# Altium footprint library 2.54-华普微电子模块.PcbLib: 59 footprints (part 1 of 4)
Each footprint in its own frame and in the unit in brackets; x right, y up, seen from the top. Pads: shape width x height; smd on the part's side, far side on the other; paste and mask are expansions set on the pad; w line width, h text height; cw(c..) or ccw(c..) is an arc to the next point about the centre after c.
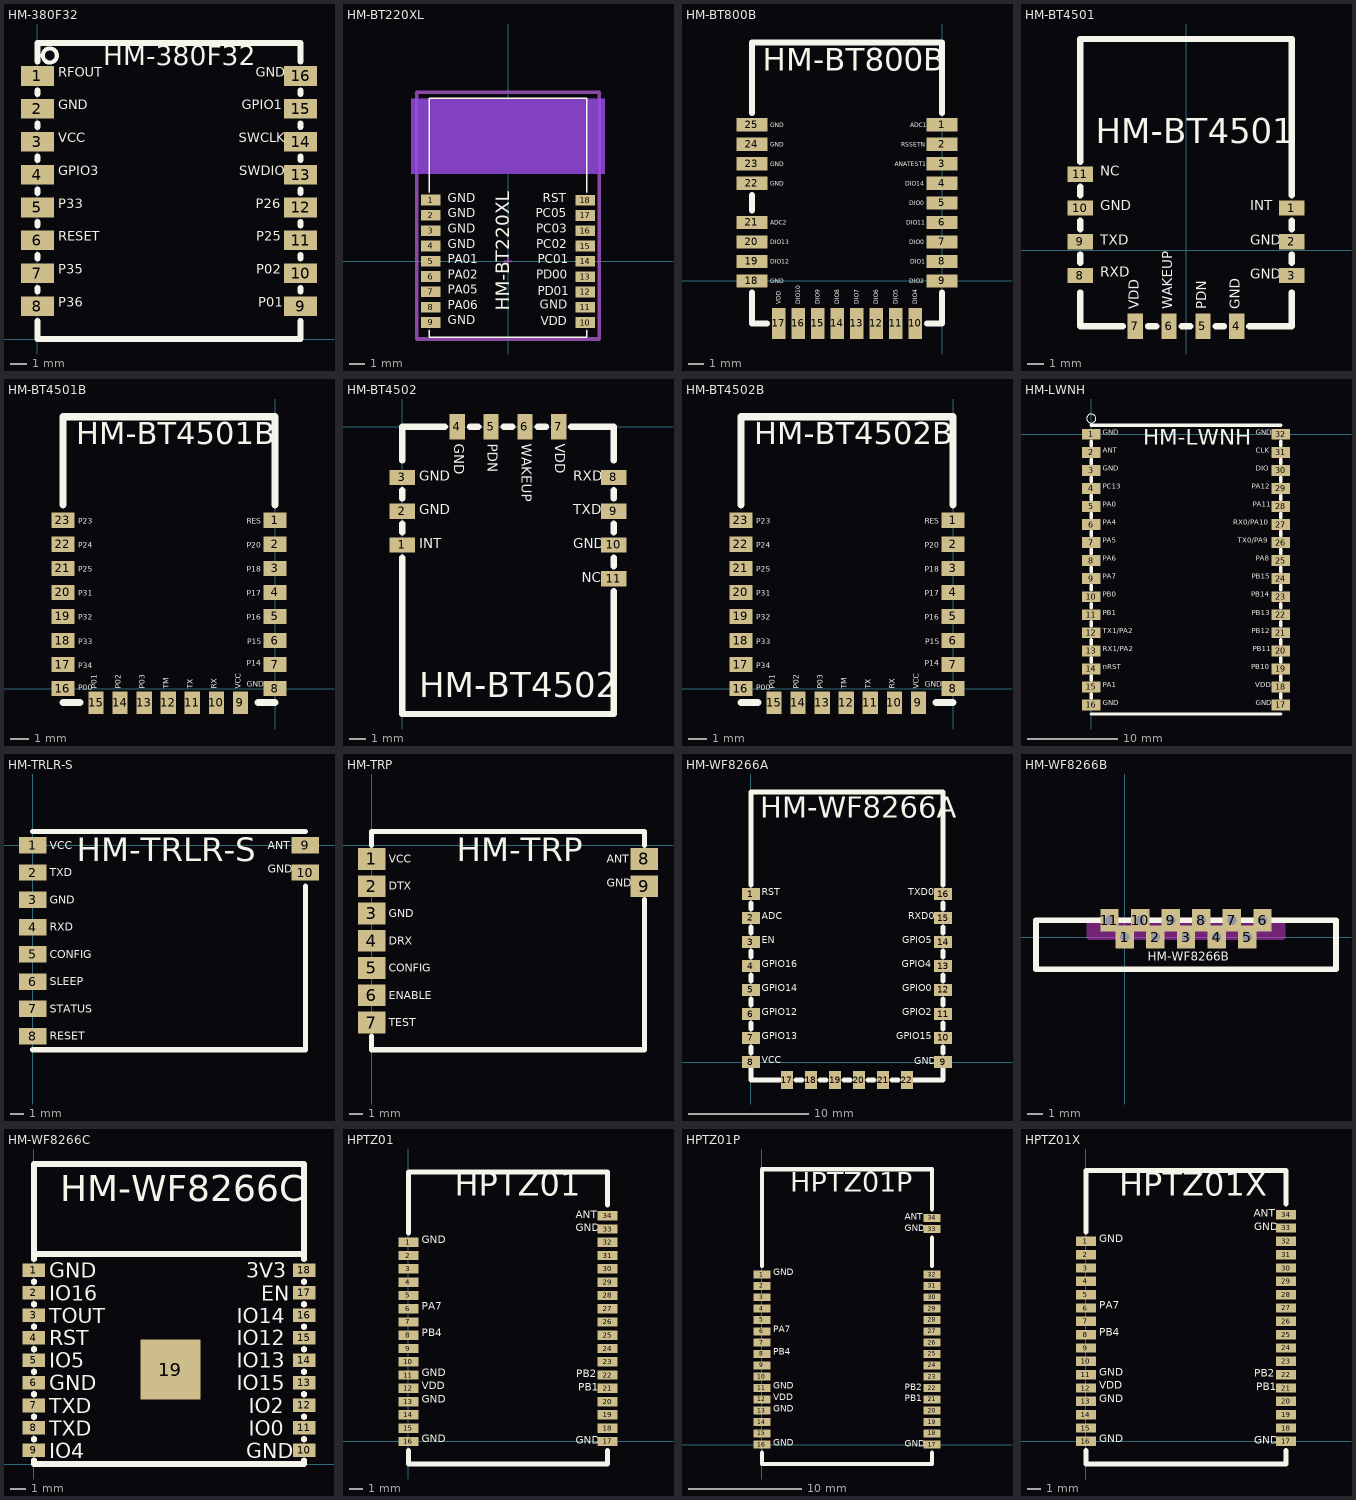
[diagram p0: the footprints below, top view; thin cyan lines are the x and y axes]

## HM-380F32 [mm]
pads (16):
  rect 2x1.2 smd: 1(0,16) 2(0,14) 3(0,12) 4(0,10) 5(0,8) 6(0,6) 7(0,4) 8(0,2) 9(16,2) 10(16,4) 11(16,6) 12(16,8) 13(16,10) 14(16,12) 15(16,14) 16(16,16)
Top Overlay:
  circle w0.254: c0.75,17.25 r0.43
  lines w0.381: 0,1.1 0,0 16,0 16,1.1 ; 0,2.9 0,3.1 ; 0,4.9 0,5.1 ; 0,6.9 0,7.1 ; 0,8.9 0,9.1 ; 0,10.9 0,11.1 ; 0,12.9 0,13.1 ; 0,14.9 0,15.1 ; 0,16.9 0,18 16,18 16,16.9 ; 16,2.9 16,3.1 ; 16,4.9 16,5.1 ; 16,6.9 16,7.1 ; 16,8.9 16,9.1 ; 16,10.9 16,11.1 ; 16,12.9 16,13.1 ; 16,14.9 16,15.1
  text "HM-380F32" at 4,16.25 h2
  text "GND" at 13.268,15.75 h1
  text "RFOUT" at 1.25,15.75 h1
  text "GPIO1" at 12.429,13.75 h1
  text "SWCLK" at 12.25,11.75 h1
  text "SWDIO" at 12.266,9.75 h1
  text "P26" at 13.266,7.75 h1
  text "P25" at 13.298,5.75 h1
  text "P02" at 13.299,3.75 h1
  text "P01" at 13.444,1.75 h1
  text "GND" at 1.25,13.75 h1
  text "VCC" at 1.25,11.75 h1
  text "GPIO3" at 1.25,9.75 h1
  text "P33" at 1.25,7.75 h1
  text "RESET" at 1.25,5.75 h1
  text "P35" at 1.25,3.75 h1
  text "P36" at 1.25,1.75 h1

## HM-BT220XL [mm] "HM-BT220XL"
pads (18):
  rect 1.3x0.7 smd: 1(-5.05,4.001) 2(-5.05,3.001) 3(-5.05,2.001) 4(-5.05,1.001) 5(-5.05,0.002) 6(-5.05,-0.998) 7(-5.05,-1.998) 8(-5.05,-2.998) 9(-5.05,-3.998) 10(5.05,-4.001) 11(5.05,-3.001) 12(5.05,-2.001) 13(5.05,-1.001) 14(5.05,-0.001) 15(5.05,0.998) 16(5.05,1.998) 17(5.05,2.998) 18(5.05,3.998)
Top Layer keep-out:
  region: 6.35,5.715 6.35,10.651 -6.35,10.651 -6.35,5.715
Bottom Layer keep-out:
  region: 6.35,5.715 6.35,10.651 -6.35,10.651 -6.35,5.715
Top Overlay:
  lines w0.1: -5.151,-4.511 -5.151,-4.972 5.15,-4.972 5.15,-4.516 ; -5.151,4.524 -5.151,10.651 5.15,10.651 5.15,4.53
  text "GND" at -3.937,-4.318 h1
  text "PA06" at -3.937,-3.33 h1
  text "PA05" at -3.937,-2.33 h1
  text "PA02" at -3.937,-1.33 h1
  text "PA01" at -3.937,-0.33 h1
  text "GND" at -3.937,0.67 h1
  text "GND" at -3.937,1.67 h1
  text "GND" at -3.937,2.67 h1
  text "GND" at -3.937,3.67 h1
  text "VDD" at 2.125,-4.38 h1
  text "GND" at 2.069,-3.302 h1
  text "PD01" at 1.959,-2.413 h1
  text "PD00" at 1.836,-1.33 h1
  text "PC01" at 1.959,-0.33 h1
  text "PC02" at 1.841,0.67 h1
  text "PC03" at 1.835,1.67 h1
  text "PC05" at 1.83,2.67 h1
  text "RST" at 2.262,3.67 h1
  text "HM-BT220XL" at 0.37,-3.233 h1.52
Mechanical 15:
  lines w0.1: -0.254,0 0.254,0 ; 0,-0.254 0,0.254
  lines w0.254: -5.969,-5.08 5.969,-5.08 5.969,11.049 -5.969,11.049 -5.969,-5.08

## HM-BT800B [mm]
pads (25):
  rect 2x0.85 smd: 1(0,10) 2(0,8.75) 3(0,7.5) 4(0,6.25) 5(0,5) 6(0,3.75) 7(0,2.5) 8(0,1.25) 9(0,0) 18(-12.19,0) 19(-12.19,1.25) 20(-12.19,2.5) 21(-12.19,3.75) 22(-12.19,6.25) 23(-12.19,7.5) 24(-12.19,8.75) 25(-12.19,10)
  rect 0.85x2 smd: 10(-1.72,-2.72) 11(-2.97,-2.72) 12(-4.22,-2.72) 13(-5.47,-2.72) 14(-6.72,-2.72) 15(-7.97,-2.72) 16(-9.22,-2.72) 17(-10.47,-2.72)
Top Overlay:
  lines w0.381: -12.19,-0.75 -12.19,-2.72 -11.22,-2.72 ; -12.19,4.5 -12.19,5.5 ; -12.19,10.75 -12.19,15.28 0,15.28 0,10.75 ; -0.97,-2.72 0,-2.72 0,-0.75
  text "ADC1" at -2.051,9.75 h0.5
  text "GND" at -11,9.75 h0.5
  text "VDD" at -10.25,-1.5 h0.5
  text "GND" at -11,8.5 h0.5
  text "RSSETN" at -2.609,8.5 h0.5
  text "GND" at -11,7.25 h0.5
  text "ANATEST1" at -3.05,7.25 h0.5
  text "GND" at -11,6 h0.5
  text "DIO14" at -2.377,6 h0.5
  text "ADC2" at -11,3.5 h0.5
  text "DIO11" at -2.286,3.5 h0.5
  text "DIO13" at -11,2.25 h0.5
  text "DIO0" at -2.112,2.25 h0.5
  text "DIO12" at -11,1 h0.5
  text "DIO1" at -2.036,1 h0.5
  text "GND" at -11,-0.25 h0.5
  text "DIO2" at -2.108,-0.25 h0.5
  text "DIO10" at -9,-1.5 h0.5
  text "DIO9" at -7.75,-1.5 h0.5
  text "DIO8" at -6.5,-1.5 h0.5
  text "DIO7" at -5.25,-1.5 h0.5
  text "DIO6" at -4,-1.5 h0.5
  text "DIO5" at -2.75,-1.5 h0.5
  text "DIO4" at -1.5,-1.5 h0.5
  text "DIO0" at -2.112,4.75 h0.5
  text "HM-BT800B" at -11.5,13 h2.5

## HM-BT4501 [mm]
pads (11):
  rect 1.5x0.9 smd: 1(6.25,2.5) 2(6.25,0.5) 3(6.25,-1.5) 8(-6.25,-1.5) 9(-6.25,0.5) 10(-6.25,2.5) 11(-6.25,4.5)
  rect 0.9x1.5 smd: 4(3,-4.5) 5(1,-4.5) 6(-1,-4.5) 7(-3,-4.5)
Top Overlay:
  lines w0.381: -6.25,-2.5 -6.25,-4.5 -3.75,-4.5 ; -6.25,-0.75 -6.25,-0.25 ; -6.25,1.25 -6.25,1.75 ; -6.25,3.25 -6.25,3.75 ; -6.25,5.25 -6.25,12.5 6.25,12.5 6.25,3.25 ; -2.25,-4.5 -1.75,-4.5 ; -0.25,-4.5 0.25,-4.5 ; 1.75,-4.5 2.25,-4.5 ; 3.75,-4.5 6.25,-4.5 6.25,-2.5 ; 6.25,-0.75 6.25,-0.25 ; 6.25,1.25 6.25,1.75
  text "HM-BT4501" at -5.334,5.842 h2.5
  text "INT" at 3.81,2.159 h1
  text "GND" at 3.81,0.127 h1
  text "GND" at 3.81,-1.905 h1
  text "GND" at 3.4,-3.5 h1
  text "PDN" at 1.4,-3.5 h1
  text "WAKEUP" at -0.6,-3.5 h1
  text "VDD" at -2.6,-3.5 h1
  text "GND" at -5.08,2.159 h1
  text "NC" at -5.08,4.191 h1
  text "RXD" at -5.08,-1.778 h1
  text "TXD" at -5.08,0.127 h1

## HM-BT4501B [mm]
pads (23):
  rect 1.2x0.8 smd: 1(0,8.89) 2(0,7.62) 3(0,6.35) 4(0,5.08) 5(0,3.81) 6(0,2.54) 7(0,1.27) 8(0,0) 16(-11.2,0) 17(-11.2,1.27) 18(-11.2,2.54) 19(-11.2,3.81) 20(-11.2,5.08) 21(-11.2,6.35) 22(-11.2,7.62) 23(-11.2,8.89)
  rect 0.8x1.2 smd: 9(-1.83,-0.74) 10(-3.1,-0.74) 11(-4.37,-0.74) 12(-5.64,-0.74) 13(-6.91,-0.74) 14(-8.18,-0.74) 15(-9.45,-0.74)
Top Overlay:
  lines w0.381: -11.2,-0.74 -10.3,-0.74 ; -11.2,9.7 -11.2,14.36 0,14.36 0,9.7 ; -0.9,-0.74 0,-0.74
  text "HM-BT4501B" at -10.5,12.5 h2
  text "TM" at -5.51,0 h0.5
  text "P03" at -6.78,0 h0.5
  text "P02" at -8.05,0 h0.5
  text "P01" at -9.32,0 h0.5
  text "TX" at -4.24,0 h0.5
  text "RX" at -2.97,0 h0.5
  text "VCC" at -1.7,0 h0.5
  text "GND" at -1.496,0 h0.5
  text "P00" at -10.4,-0.2 h0.5
  text "P14" at -1.5,1.1 h0.5
  text "P34" at -10.4,0.98 h0.5
  text "P15" at -1.482,2.25 h0.5
  text "P33" at -10.4,2.25 h0.5
  text "P16" at -1.497,3.52 h0.5
  text "P32" at -10.4,3.52 h0.5
  text "P17" at -1.49,4.79 h0.5
  text "P31" at -10.4,4.79 h0.5
  text "P18" at -1.485,6.06 h0.5
  text "P25" at -10.4,6.06 h0.5
  text "P20" at -1.484,7.33 h0.5
  text "P24" at -10.4,7.33 h0.5
  text "P23" at -10.4,8.6 h0.5
  text "RES" at -1.491,8.6 h0.5

## HM-BT4502 [mm]
pads (11):
  rect 1.5x0.9 smd: 1(0,-7) 2(0,-5) 3(0,-3) 8(12.5,-3) 9(12.5,-5) 10(12.5,-7) 11(12.5,-9)
  rect 0.9x1.5 smd: 4(3.25,0) 5(5.25,0) 6(7.25,0) 7(9.25,0)
Top Overlay:
  lines w0.381: 0,-7.75 0,-17 12.5,-17 12.5,-9.75 ; 0,-6.25 0,-5.75 ; 0,-4.25 0,-3.75 ; 0,-2 0,0 2.5,0 ; 4,0 4.5,0 ; 6,0 6.5,0 ; 8,0 8.5,0 ; 10,0 12.5,0 12.5,-2 ; 12.5,-8.25 12.5,-7.75 ; 12.5,-6.25 12.5,-5.75 ; 12.5,-4.25 12.5,-3.75
  text "NC" at 10.6,-9.4 h1
  text "GND" at 10.105,-7.4 h1
  text "TXD" at 10.113,-5.4 h1
  text "RXD" at 10.113,-3.4 h1
  text "VDD" at 8.85,-1 h1
  text "WAKEUP" at 6.85,-1 h1
  text "PDN" at 4.85,-1 h1
  text "GND" at 2.85,-1 h1
  text "GND" at 1,-3.4 h1
  text "GND" at 1,-5.4 h1
  text "INT" at 1,-7.4 h1
  text "HM-BT4502" at 1,-16.5 h2.5

## HM-BT4502B [mm]
pads (23):
  rect 1.2x0.8 smd: 1(0,8.89) 2(0,7.62) 3(0,6.35) 4(0,5.08) 5(0,3.81) 6(0,2.54) 7(0,1.27) 8(0,0) 16(-11.2,0) 17(-11.2,1.27) 18(-11.2,2.54) 19(-11.2,3.81) 20(-11.2,5.08) 21(-11.2,6.35) 22(-11.2,7.62) 23(-11.2,8.89)
  rect 0.8x1.2 smd: 9(-1.83,-0.74) 10(-3.1,-0.74) 11(-4.37,-0.74) 12(-5.64,-0.74) 13(-6.91,-0.74) 14(-8.18,-0.74) 15(-9.45,-0.74)
Top Overlay:
  lines w0.381: -11.2,-0.74 -10.3,-0.74 ; -11.2,9.7 -11.2,14.36 0,14.36 0,9.7 ; -0.9,-0.74 0,-0.74
  text "RES" at -1.491,8.6 h0.5
  text "P23" at -10.4,8.6 h0.5
  text "P24" at -10.4,7.33 h0.5
  text "P20" at -1.484,7.33 h0.5
  text "P25" at -10.4,6.06 h0.5
  text "P18" at -1.485,6.06 h0.5
  text "P31" at -10.4,4.79 h0.5
  text "P17" at -1.49,4.79 h0.5
  text "P32" at -10.4,3.52 h0.5
  text "P16" at -1.497,3.52 h0.5
  text "P33" at -10.4,2.25 h0.5
  text "P15" at -1.482,2.25 h0.5
  text "P34" at -10.4,0.98 h0.5
  text "P14" at -1.5,1.1 h0.5
  text "P00" at -10.4,-0.2 h0.5
  text "GND" at -1.496,0 h0.5
  text "VCC" at -1.7,0 h0.5
  text "RX" at -2.97,0 h0.5
  text "TX" at -4.24,0 h0.5
  text "P01" at -9.32,0 h0.5
  text "P02" at -8.05,0 h0.5
  text "P03" at -6.78,0 h0.5
  text "TM" at -5.51,0 h0.5
  text "HM-BT4502B" at -10.5,12.5 h2

## HM-LWNH [mm]
pads (32):
  rect 2x1.2 smd: 1(0,0) 2(0,-2) 3(0,-4) 4(0,-6) 5(0,-8) 6(0,-10) 7(0,-12) 8(0,-14) 9(0,-16) 10(0,-18) 11(0,-20) 12(0,-22) 13(0,-24) 14(0,-26) 15(0,-28) 16(0,-30) 17(21,-30) 18(21,-28) 19(21,-26) 20(21,-24) 21(21,-22) 22(21,-20) 23(21,-18) 24(21,-16) 25(21,-14) 26(21,-12) 27(21,-10) 28(21,-8) 29(21,-6) 30(21,-4) 31(21,-2) 32(21,0)
Top Overlay:
  circle w0.1: c0,1.75 r0.5
  lines w0.381: 0,-31 21,-31 ; 0,-29.25 0,-28.75 ; 0,-27.25 0,-26.75 ; 0,-25.25 0,-24.75 ; 0,-23.25 0,-22.75 ; 0,-21.25 0,-20.75 ; 0,-19.25 0,-18.75 ; 0,-17.25 0,-16.75 ; 0,-15.25 0,-14.75 ; 0,-13.25 0,-12.75 ; 0,-11.25 0,-10.75 ; 0,-9.25 0,-8.75 ; 0,-7.25 0,-6.75 ; 0,-5.25 0,-4.75 ; 0,-3.25 0,-2.75 ; 0,-1.25 0,-0.75 ; 0,1 21,1 ; 21,-29.25 21,-28.75 ; 21,-27.25 21,-26.75 ; 21,-25.25 21,-24.75 ; 21,-23.25 21,-22.75 ; 21,-21.25 21,-20.75 ; 21,-19.25 21,-18.75 ; 21,-17.25 21,-16.75 ; 21,-15.25 21,-14.75 ; 21,-13.25 21,-12.75 ; 21,-11.25 21,-10.75 ; 21,-9.25 21,-8.75 ; 21,-7.25 21,-6.75 ; 21,-5.25 21,-4.75 ; 21,-3.25 21,-2.75 ; 21,-1.25 21,-0.75
  text "HM-LWNH" at 5.75,-1.75 h3
  text "GND" at 1.25,-30.25 h1
  text "GND" at 18.231,-30.25 h1
  text "PA1" at 1.25,-28.25 h1
  text "VDD" at 18.203,-28.25 h1
  text "nRST" at 1.25,-26.25 h1
  text "PB10" at 17.755,-26.25 h1
  text "RX1/PA2" at 1.25,-24.25 h1
  text "PB11" at 17.907,-24.25 h1
  text "TX1/PA2" at 1.25,-22.25 h1
  text "PB12" at 17.763,-22.25 h1
  text "PB1" at 1.25,-20.25 h1
  text "PB13" at 17.763,-20.25 h1
  text "PB0" at 1.25,-18.25 h1
  text "PB14" at 17.724,-18.25 h1
  text "PA7" at 1.25,-16.25 h1
  text "PB15" at 17.761,-16.25 h1
  text "PA6" at 1.25,-14.25 h1
  text "PA8" at 18.254,-14.25 h1
  text "PA5" at 1.25,-12.25 h1
  text "TX0/PA9" at 16.257,-12.25 h1
  text "PA4" at 1.25,-10.25 h1
  text "RX0/PA10" at 15.75,-10.25 h1
  text "PA0" at 1.25,-8.25 h1
  text "PA11" at 17.907,-8.25 h1
  text "PC13" at 1.25,-6.25 h1
  text "PA12" at 17.763,-6.25 h1
  text "GND" at 1.25,-4.25 h1
  text "DIO" at 18.234,-4.25 h1
  text "ANT" at 1.25,-2.25 h1
  text "CLK" at 18.211,-2.25 h1
  text "GND" at 18.231,-0.25 h1
  text "GND" at 1.25,-0.25 h1

## HM-TRLR-S [mm]
pads (10):
  rect 2x1.2 smd: 1(0,0) 2(0,-2) 3(0,-4) 4(0,-6) 5(0,-8) 6(0,-10) 7(0,-12) 8(0,-14) 9(20,0) 10(20,-2)
Top Overlay:
  lines w0.381: 0,-15 20,-15 20,-3 ; 0,1 20,1
  text "VCC" at 1.25,-0.5 h1
  text "ANT" at 17.239,-0.5 h1
  text "GND" at 17.25,-2.25 h1
  text "TXD" at 1.25,-2.5 h1
  text "GND" at 1.25,-4.5 h1
  text "RXD" at 1.25,-6.5 h1
  text "CONFIG" at 1.25,-8.5 h1
  text "SLEEP" at 1.25,-10.5 h1
  text "STATUS" at 1.25,-12.5 h1
  text "RESET" at 1.25,-14.5 h1
  text "HM-TRLR-S" at 3.25,-1.75 h3

## HM-TRP [mm]
pads (9):
  rect 2x1.6 smd: 1(0,-1) 2(0,-3) 3(0,-5) 4(0,-7) 5(0,-9) 6(0,-11) 7(0,-13) 8(20,-1) 9(20,-3)
Top Overlay:
  lines w0.381: 0,-14 0,-15 20,-15 20,-4 ; 0,0 0,1 20,1 20,0
  text "HM-TRP" at 6.25,-1.75 h3
  text "TEST" at 1.25,-13.5 h1
  text "ENABLE" at 1.25,-11.5 h1
  text "CONFIG" at 1.25,-9.5 h1
  text "DRX" at 1.25,-7.5 h1
  text "GND" at 1.25,-5.5 h1
  text "DTX" at 1.25,-3.5 h1
  text "GND" at 17.25,-3.25 h1
  text "ANT" at 17.239,-1.5 h1
  text "VCC" at 1.25,-1.5 h1

## HM-WF8266A [mm]
pads (22):
  rect 1.5x1 smd: 1(0,14) 2(0,12) 3(0,10) 4(0,8) 5(0,6) 6(0,4) 7(0,2) 8(0,0) 9(16,0) 10(16,2) 11(16,4) 12(16,6) 13(16,8) 14(16,10) 15(16,12) 16(16,14)
  rect 1x1.5 smd: 17(3,-1.5) 18(5,-1.5) 19(7,-1.5) 20(9,-1.5) 21(11,-1.5) 22(13,-1.5)
Top Overlay:
  lines w0.381: 0,-0.5 0,-1.5 2.5,-1.5 ; 0,0.75 0,1.25 ; 0,2.75 0,3.25 ; 0,4.75 0,5.25 ; 0,6.75 0,7.25 ; 0,8.75 0,9.25 ; 0,10.75 0,11.25 ; 0,12.75 0,13.25 ; 0,14.75 0,22.5 16,22.5 16,14.75 ; 3.75,-1.5 4.25,-1.5 ; 5.75,-1.5 6.25,-1.5 ; 7.75,-1.5 8.25,-1.5 ; 9.75,-1.5 10.25,-1.5 ; 11.75,-1.5 12.25,-1.5 ; 13.5,-1.5 16,-1.5 16,-0.5 ; 16,0.75 16,1.25 ; 16,2.75 16,3.25 ; 16,4.75 16,5.25 ; 16,6.75 16,7.25 ; 16,8.75 16,9.25 ; 16,10.75 16,11.25 ; 16,12.75 16,13.25
  text "HM-WF8266A" at 0.75,19.75 h3
  text "RST" at 0.9,13.7 h1
  text "TXD0" at 13.116,13.7 h1
  text "RXD0" at 13.116,11.7 h1
  text "ADC" at 0.9,11.7 h1
  text "GPIO5" at 12.615,9.7 h1
  text "EN" at 0.9,9.7 h1
  text "GPIO4" at 12.578,7.7 h1
  text "GPIO16" at 0.9,7.7 h1
  text "GPIO0" at 12.61,5.7 h1
  text "GPIO14" at 0.9,5.7 h1
  text "GPIO2" at 12.617,3.7 h1
  text "GPIO12" at 0.9,3.7 h1
  text "GPIO15" at 12.116,1.7 h1
  text "GPIO13" at 0.9,1.7 h1
  text "GND" at 13.6,-0.4 h1
  text "VCC" at 0.9,-0.3 h1

## HM-WF8266B [mm]
pads (11):
  rect 1.2x1.5 hole 0.6: 1(0,0) 2(2,0) 3(4,0) 4(6,0) 5(8,0) 6(9,1.1) 7(7,1.1) 8(5,1.1) 9(3,1.1) 10(1,1.1) 11(-1,1.1)
Top Overlay:
  lines w0.381: -5.8,-2.1 13.8,-2.1 13.8,1.1 -2.3,1.1 -5.8,1.1 -5.8,-2.1
  text "HM-WF8266B" at 1.5,-1.75 h1
Keep-Out Layer:
  region: -2.3,0 -2.3,1.1 10.3,1.1 10.3,0
  lines w0.381: -2.3,0 0,0 8,0 10.3,0 10.3,1.1 9,1.1 -1,1.1 -2.3,1.1 -2.3,0

## HM-WF8266C [mm]
pads (19):
  rect 1.5x0.9 smd: 1(0,12.9) 2(0,11.4) 3(0,9.9) 4(0,8.4) 5(0,6.9) 6(0,5.4) 7(0,3.9) 8(0,2.4) 9(0,0.9) 10(18,0.9) 11(18,2.4) 12(18,3.9) 13(18,5.4) 14(18,6.9) 15(18,8.4) 16(18,9.9) 17(18,11.4) 18(18,12.9)
  rect 4x4 smd: 19(9.1,6.29)
Top Overlay:
  lines w0.381: 0,0.25 0,0 18,0 18,0.25 ; 0,1.625 0,1.675 ; 0,3.125 0,3.175 ; 0,4.625 0,4.675 ; 0,6.125 0,6.175 ; 0,7.625 0,7.675 ; 0,9.125 0,9.175 ; 0,10.625 0,10.675 ; 0,12.125 0,12.175 ; 0,13.65 0,20 18,20 18,13.65 ; 0,14 18,14 ; 18,1.625 18,1.675 ; 18,3.125 18,3.175 ; 18,4.625 18,4.675 ; 18,6.125 18,6.175 ; 18,7.625 18,7.675 ; 18,9.125 18,9.175 ; 18,10.625 18,10.675 ; 18,12.125 18,12.175
  text "IO4" at 1,0.4 h1
  text "GND" at 14.166,0.4 h1
  text "TXD" at 1,1.9 h1
  text "IO0" at 14.333,1.9 h1
  text "TXD" at 1,3.4 h1
  text "IO2" at 14.333,3.4 h1
  text "GND" at 1,4.9 h1
  text "IO15" at 13.5,4.9 h1
  text "IO5" at 1,6.4 h1
  text "IO13" at 13.5,6.4 h1
  text "RST" at 1,7.9 h1
  text "IO12" at 13.5,7.9 h1
  text "TOUT" at 1,9.4 h1
  text "IO14" at 13.5,9.4 h1
  text "IO16" at 1,10.9 h1
  text "EN" at 15.166,10.9 h1
  text "3V3" at 14.166,12.4 h1
  text "GND" at 1,12.4 h1
  text "HM-WF8266C" at 1.75,16.9 h3

## HPTZ01 [mm]
pads (34):
  rect 1.5x0.7 smd: 1(0,15) 2(0,14) 3(0,13) 4(0,12) 5(0,11) 6(0,10) 7(0,9) 8(0,8) 9(0,7) 10(0,6) 11(0,5) 12(0,4) 13(0,3) 14(0,2) 15(0,1) 16(0,0) 17(15,0) 18(15,1) 19(15,2) 20(15,3) 21(15,4) 22(15,5) 23(15,6) 24(15,7) 25(15,8) 26(15,9) 27(15,10) 28(15,11) 29(15,12) 30(15,13) 31(15,14) 32(15,15) 33(15,16) 34(15,17)
Top Overlay:
  lines w0.381: 0,-0.7 0,-1.7 15,-1.7 15,-0.7 ; 0,15.7 0,20.3 15,20.3 15,17.8
  text "HPTZ01" at 3.5,17.9 h3
  text "GND" at 1,14.7 h1
  text "PA7" at 1,9.7 h1
  text "PB4" at 1,7.7 h1
  text "GND" at 1,4.7 h1
  text "VDD" at 1,3.7 h1
  text "GND" at 1,2.7 h1
  text "GND" at 1,-0.3 h1
  text "ANT" at 12.589,16.6 h1
  text "GND" at 12.6,15.6 h1
  text "PB1" at 12.776,3.6 h1
  text "PB2" at 12.631,4.6 h1
  text "GND" at 12.6,-0.4 h1

## HPTZ01P [mm]
pads (34):
  rect 1.5x0.7 smd: 1(0,15) 2(0,14) 3(0,13) 4(0,12) 5(0,11) 6(0,10) 7(0,9) 8(0,8) 9(0,7) 10(0,6) 11(0,5) 12(0,4) 13(0,3) 14(0,2) 15(0,1) 16(0,0) 17(15,0) 18(15,1) 19(15,2) 20(15,3) 21(15,4) 22(15,5) 23(15,6) 24(15,7) 25(15,8) 26(15,9) 27(15,10) 28(15,11) 29(15,12) 30(15,13) 31(15,14) 32(15,15) 33(15,19) 34(15,20)
Top Overlay:
  lines w0.381: 0,-0.7 0,-1.7 15,-1.7 15,-0.7 ; 0,15.75 0,24.3 15,24.3 15,20.75 ; 15,15.75 15,18.25
  text "GND" at 1,14.7 h1
  text "PA7" at 1,9.7 h1
  text "PB4" at 1,7.7 h1
  text "GND" at 1,4.7 h1
  text "VDD" at 1,3.7 h1
  text "GND" at 1,2.7 h1
  text "GND" at 1,-0.3 h1
  text "PB1" at 12.6,3.6 h1
  text "PB2" at 12.6,4.6 h1
  text "GND" at 12.6,-0.4 h1
  text "GND" at 12.6,18.6 h1
  text "ANT" at 12.6,19.6 h1
  text "HPTZ01P" at 2.5,21.75 h3

## HPTZ01X [mm]
pads (34):
  rect 1.5x0.7 smd: 1(0,15) 2(0,14) 3(0,13) 4(0,12) 5(0,11) 6(0,10) 7(0,9) 8(0,8) 9(0,7) 10(0,6) 11(0,5) 12(0,4) 13(0,3) 14(0,2) 15(0,1) 16(0,0) 17(15,0) 18(15,1) 19(15,2) 20(15,3) 21(15,4) 22(15,5) 23(15,6) 24(15,7) 25(15,8) 26(15,9) 27(15,10) 28(15,11) 29(15,12) 30(15,13) 31(15,14) 32(15,15) 33(15,16) 34(15,17)
Top Overlay:
  lines w0.381: 0,-0.7 0,-1.7 15,-1.7 15,-0.7 ; 0,15.7 0,20.3 15,20.3 15,17.8
  text "HPTZ01X" at 2.5,17.8 h3
  text "GND" at 1,14.7 h1
  text "PA7" at 1,9.7 h1
  text "PB4" at 1,7.7 h1
  text "GND" at 1,4.7 h1
  text "VDD" at 1,3.7 h1
  text "GND" at 1,2.7 h1
  text "GND" at 1,-0.3 h1
  text "ANT" at 12.589,16.6 h1
  text "GND" at 12.6,15.6 h1
  text "PB1" at 12.776,3.6 h1
  text "PB2" at 12.631,4.6 h1
  text "GND" at 12.6,-0.4 h1